# Altium footprint library PcbLib1.PcbLib: 120 footprints (part 8 of 8)
Each footprint in its own frame and in the unit in brackets; x right, y up, seen from the top. Pads: shape width x height; smd on the part's side, far side on the other; paste and mask are expansions set on the pad; w line width, h text height; cw(c..) or ccw(c..) is an arc to the next point about the centre after c.
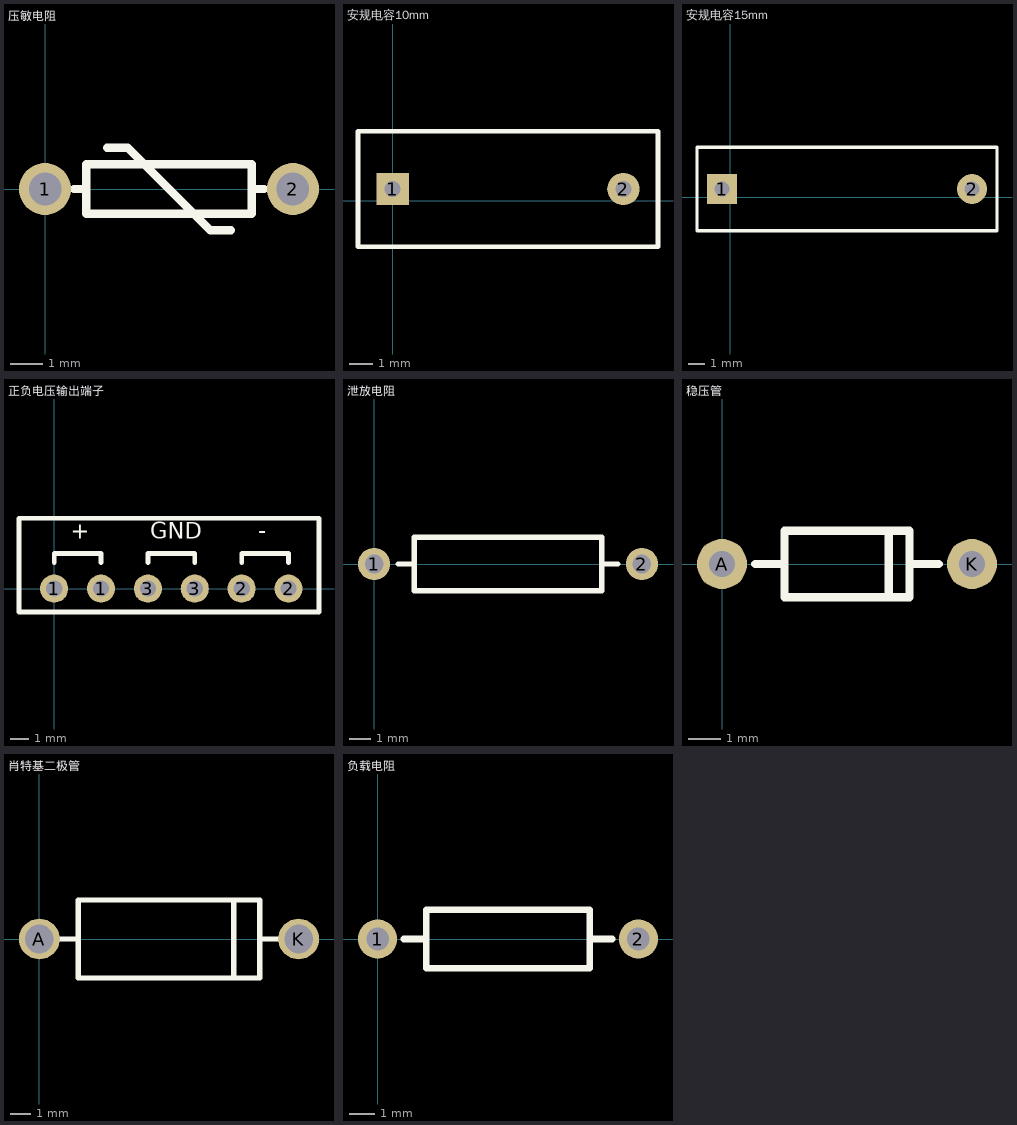
[diagram p7: the footprints below, top view; thin cyan lines are the x and y axes]

## 压敏电阻 [mm]
pads (2):
  round 1.6 hole 1: 1(0,0) 2(7.62,0)
Top Overlay:
  lines w0.254: 0.889,0 1.27,0 ; 1.905,1.27 2.54,1.27 5.08,-1.27 5.715,-1.27 ; 6.35,0 6.731,0 ; 1.27,-0.762 6.35,-0.762 6.35,0.762 1.27,0.762 1.27,-0.762

## 安规电容10mm [mm]
pads (2):
  rect 1.4x1.4 hole 0.7: 1(0,0.5)
  round 1.4 hole 0.7: 2(10,0.5)
Top Overlay:
  lines w0.2: -1.5,-2 -1.5,3 11.5,3 11.5,-2 -1.5,-2

## 安规电容15mm [mm]
pads (2):
  rect 1.8x1.8 hole 0.9: 1(-0.5,0.5)
  round 1.8 hole 0.9: 2(14.5,0.5)
Top Overlay:
  lines w0.2: -2,-2 -2,3 16,3 16,-2 -2,-2

## 正负电压输出端子 [mil]
pads (6):
  round 60 hole 34.65: 1(0,0) 1(100,0) 2(400,0) 2(500,0) 3(200,0) 3(300,0)
Top Overlay:
  lines w10: 0,55 0,75 100,75 100,55 ; 200,55 200,75 300,75 300,55 ; 400,55 400,75 500,75 500,55 ; -75,-50 565,-50 565,150 -75,150 -75,-50
  text "GND" at 205,95 h60
  text "-" at 435,95 h60
  text "+" at 35,95 h60

## 泄放电阻 [mil]
pads (2):
  round 60 hole 34.65: 1(0,0) 2(500,0)
Top Overlay:
  lines w10: 45,0 75,0 ; 425,0 455,0 ; 75,-50 75,50 425,50 425,-50 75,-50

## 稳压管 [mil]
pads (2):
  round 60 hole 31.5: A(0,0) K(300,0)
Top Overlay:
  lines w10: 40,0 75,0 ; 200,-40 200,40 ; 225,0 260,0 ; 75,-40 225,-40 225,40 75,40 75,-40

## 肖特基二极管 [mm]
pads (2):
  round 2 hole 1.4: A(0,0) K(12.7,0)
Top Overlay:
  lines w0.254: 1.016,0 1.905,0 ; 9.525,-1.905 9.525,1.905 ; 10.795,0 11.684,0 ; 1.905,-1.905 1.905,1.905 10.795,1.905 10.795,-1.905 1.905,-1.905

## 负载电阻 [mil]
pads (2):
  round 60 hole 34.65: 1(0,0) 2(400,0)
Top Overlay:
  lines w10: 40,0 75,0 ; 325,0 360,0 ; 75,-45 325,-45 325,45 75,45 75,-45